# Altium footprint library cool_library.PcbLib: 1182 footprints (part 7 of 75) (continued)
## BGA356X24VF-0.5 [mm] (continued)
Top Overlay:
  lines w0.203: -1.778,0 -1.092,0 ; -1.524,-11.5 -1.016,-11.5 ; -1.473,-0.254 -1.092,0 ; -1.473,0.254 -1.092,0 ; -0.762,0 0,0.762 ; 0,-13.024 0,-12.516 ; 0,1.016 0,1.524 ; 11,-13.024 11,-12.516 ; 11.5,1.016 11.5,1.524 ; 12.516,-11.5 13.024,-11.5 ; 12.516,0 13.024,0 ; -0.762,-12.243 12.243,-12.243 12.243,0.762 -0.762,0.762 -0.762,-12.243

## BGA423x24 [mm]
pads (423):
  round 0.35 smd: A1(0,0) A2(0.65,0) A4(1.95,0) A5(2.6,0) A7(3.9,0) A8(4.55,0) A10(5.85,0) A11(6.5,0) A13(7.8,0) A14(8.45,0) A16(9.75,0) A17(10.4,0) A19(11.7,0) A20(12.35,0) A22(13.65,0) A23(14.3,0) A24(14.95,0) AA1(0,-13) AA2(0.65,-13) AA6(3.25,-13) AA7(3.9,-13) AA9(5.2,-13) AA10(5.85,-13) AA12(7.15,-13) AA13(7.8,-13) AA15(9.1,-13) AA16(9.75,-13) AA18(11.05,-13) AA19(11.7,-13) AA23(14.3,-13) AB2(0.65,-13.65) AB3(1.3,-13.65) AB5(2.6,-13.65) AB6(3.25,-13.65) AB7(3.9,-13.65) AB9(5.2,-13.65) AB10(5.85,-13.65) AB12(7.15,-13.65) AB13(7.8,-13.65) AB15(9.1,-13.65) AB16(9.75,-13.65) AB18(11.05,-13.65) AB19(11.7,-13.65) AB20(12.35,-13.65) AB22(13.65,-13.65) AB23(14.3,-13.65) AB24(14.95,-13.65) AC1(0,-14.3) AC2(0.65,-14.3) AC3(1.3,-14.3) AC4(1.95,-14.3) AC5(2.6,-14.3) AC6(3.25,-14.3) AC7(3.9,-14.3) AC8(4.55,-14.3) AC9(5.2,-14.3) AC10(5.85,-14.3) AC11(6.5,-14.3) AC12(7.15,-14.3) AC13(7.8,-14.3) AC14(8.45,-14.3) AC15(9.1,-14.3) AC16(9.75,-14.3) AC17(10.4,-14.3) AC18(11.05,-14.3) AC19(11.7,-14.3) AC20(12.35,-14.3) AC21(13,-14.3) AC22(13.65,-14.3) AC23(14.3,-14.3) AC24(14.95,-14.3) AD1(0,-14.95) AD2(0.65,-14.95) AD3(1.3,-14.95) AD5(2.6,-14.95) AD6(3.25,-14.95) AD8(4.55,-14.95) AD9(5.2,-14.95) AD11(6.5,-14.95) AD12(7.15,-14.95) AD14(8.45,-14.95) AD15(9.1,-14.95) AD17(10.4,-14.95) AD18(11.05,-14.95) AD20(12.35,-14.95) AD21(13,-14.95) AD23(14.3,-14.95) AD24(14.95,-14.95) B1(0,-0.65) B2(0.65,-0.65) B3(1.3,-0.65) B4(1.95,-0.65) B5(2.6,-0.65) B6(3.25,-0.65) B7(3.9,-0.65) B8(4.55,-0.65) B9(5.2,-0.65) B10(5.85,-0.65) B11(6.5,-0.65) B12(7.15,-0.65) B13(7.8,-0.65) B14(8.45,-0.65) B15(9.1,-0.65) B16(9.75,-0.65) B17(10.4,-0.65) B18(11.05,-0.65) B19(11.7,-0.65) B20(12.35,-0.65) B21(13,-0.65) B22(13.65,-0.65) B23(14.3,-0.65) B24(14.95,-0.65) C1(0,-1.3) C2(0.65,-1.3) C3(1.3,-1.3) C5(2.6,-1.3) C6(3.25,-1.3) C7(3.9,-1.3) C9(5.2,-1.3) C10(5.85,-1.3) C12(7.15,-1.3) C13(7.8,-1.3) C15(9.1,-1.3) C16(9.75,-1.3) C18(11.05,-1.3) C19(11.7,-1.3) C20(12.35,-1.3) C22(13.65,-1.3) C23(14.3,-1.3) D2(0.65,-1.95) D6(3.25,-1.95) D7(3.9,-1.95) D9(5.2,-1.95) D10(5.85,-1.95) D12(7.15,-1.95) D13(7.8,-1.95) D15(9.1,-1.95) D16(9.75,-1.95) D18(11.05,-1.95) D19(11.7,-1.95) D23(14.3,-1.95) D24(14.95,-1.95) E1(0,-2.6) E2(0.65,-2.6) E3(1.3,-2.6) E7(3.9,-2.6) E9(5.2,-2.6) E10(5.85,-2.6) E12(7.15,-2.6) E13(7.8,-2.6) E15(9.1,-2.6) E16(9.75,-2.6) E18(11.05,-2.6) E22(13.65,-2.6) E23(14.3,-2.6) E24(14.95,-2.6) F1(0,-3.25) F2(0.65,-3.25) F3(1.3,-3.25) F4(1.95,-3.25) F6(3.25,-3.25) F7(3.9,-3.25) F9(5.2,-3.25) F10(5.85,-3.25) F12(7.15,-3.25) F13(7.8,-3.25) F15(9.1,-3.25) F16(9.75,-3.25) F18(11.05,-3.25) F19(11.7,-3.25) F21(13,-3.25) F22(13.65,-3.25) F23(14.3,-3.25) G2(0.65,-3.9) G3(1.3,-3.9) G4(1.95,-3.9) G5(2.6,-3.9) G6(3.25,-3.9) G7(3.9,-3.9) G9(5.2,-3.9) G10(5.85,-3.9) G12(7.15,-3.9) G13(7.8,-3.9) G15(9.1,-3.9) G16(9.75,-3.9) G18(11.05,-3.9) G19(11.7,-3.9) G20(12.35,-3.9) G21(13,-3.9) G22(13.65,-3.9) G23(14.3,-3.9) G24(14.95,-3.9) H1(0,-4.55) H2(0.65,-4.55) H8(4.55,-4.55) H9(5.2,-4.55) H10(5.85,-4.55) H11(6.5,-4.55) H12(7.15,-4.55) H13(7.8,-4.55) H14(8.45,-4.55) H15(9.1,-4.55) H16(9.75,-4.55) H17(10.4,-4.55) H23(14.3,-4.55) H24(14.95,-4.55) J1(0,-5.2) J2(0.65,-5.2) J3(1.3,-5.2) J4(1.95,-5.2) J6(3.25,-5.2) J7(3.9,-5.2) J8(4.55,-5.2) J9(5.2,-5.2) J10(5.85,-5.2) J11(6.5,-5.2) J12(7.15,-5.2) J13(7.8,-5.2) J14(8.45,-5.2) J15(9.1,-5.2) J16(9.75,-5.2) J17(10.4,-5.2) J18(11.05,-5.2) J19(11.7,-5.2) J20(12.35,-5.2) J21(13,-5.2) J22(13.65,-5.2) J23(14.3,-5.2) K2(0.65,-5.85) K3(1.3,-5.85) K4(1.95,-5.85) K5(2.6,-5.85) K6(3.25,-5.85) K7(3.9,-5.85) K8(4.55,-5.85) K10(5.85,-5.85) K11(6.5,-5.85) K14(8.45,-5.85) K15(9.1,-5.85) K17(10.4,-5.85) K18(11.05,-5.85) K19(11.7,-5.85) K20(12.35,-5.85) K21(13,-5.85) K22(13.65,-5.85) K23(14.3,-5.85) K24(14.95,-5.85) L1(0,-6.5) L2(0.65,-6.5) L8(4.55,-6.5) L10(5.85,-6.5) L11(6.5,-6.5) L12(7.15,-6.5) L13(7.8,-6.5) L14(8.45,-6.5) L15(9.1,-6.5) L17(10.4,-6.5) L23(14.3,-6.5) L24(14.95,-6.5) M1(0,-7.15) M2(0.65,-7.15) M3(1.3,-7.15) M4(1.95,-7.15) M5(2.6,-7.15) M6(3.25,-7.15) M7(3.9,-7.15) M8(4.55,-7.15) M9(5.2,-7.15) M10(5.85,-7.15) M11(6.5,-7.15) M12(7.15,-7.15) M13(7.8,-7.15) M14(8.45,-7.15) M15(9.1,-7.15) M16(9.75,-7.15) M17(10.4,-7.15) M18(11.05,-7.15) M19(11.7,-7.15) M20(12.35,-7.15) M21(13,-7.15) M22(13.65,-7.15) M23(14.3,-7.15) N2(0.65,-7.8) N3(1.3,-7.8) N4(1.95,-7.8) N5(2.6,-7.8) N6(3.25,-7.8) N7(3.9,-7.8) N8(4.55,-7.8) N9(5.2,-7.8) N10(5.85,-7.8) N11(6.5,-7.8) N12(7.15,-7.8) N13(7.8,-7.8) N14(8.45,-7.8) N15(9.1,-7.8) N16(9.75,-7.8) N17(10.4,-7.8) N18(11.05,-7.8) N19(11.7,-7.8) N20(12.35,-7.8) N21(13,-7.8) N22(13.65,-7.8) N23(14.3,-7.8) N24(14.95,-7.8) P1(0,-8.45) P2(0.65,-8.45) P8(4.55,-8.45) P10(5.85,-8.45) P11(6.5,-8.45) P12(7.15,-8.45) P13(7.8,-8.45) P14(8.45,-8.45) P15(9.1,-8.45) P17(10.4,-8.45) P23(14.3,-8.45) P24(14.95,-8.45) R1(0,-9.1) R2(0.65,-9.1) R3(1.3,-9.1) R4(1.95,-9.1) R5(2.6,-9.1) R6(3.25,-9.1) R7(3.9,-9.1) R8(4.55,-9.1) R10(5.85,-9.1) R11(6.5,-9.1) R14(8.45,-9.1) R15(9.1,-9.1) R17(10.4,-9.1) R18(11.05,-9.1) R19(11.7,-9.1) R20(12.35,-9.1) R21(13,-9.1) R22(13.65,-9.1) R23(14.3,-9.1) T2(0.65,-9.75) T3(1.3,-9.75) T4(1.95,-9.75) T5(2.6,-9.75) T6(3.25,-9.75) T7(3.9,-9.75) T8(4.55,-9.75) T9(5.2,-9.75) T10(5.85,-9.75) T11(6.5,-9.75) T12(7.15,-9.75) T13(7.8,-9.75) T14(8.45,-9.75) T15(9.1,-9.75) T16(9.75,-9.75) T17(10.4,-9.75) T18(11.05,-9.75) T19(11.7,-9.75) T20(12.35,-9.75) T21(13,-9.75) T22(13.65,-9.75) T23(14.3,-9.75) T24(14.95,-9.75) U1(0,-10.4) U2(0.65,-10.4) U8(4.55,-10.4) U9(5.2,-10.4) U10(5.85,-10.4) U11(6.5,-10.4) U12(7.15,-10.4) U13(7.8,-10.4) U14(8.45,-10.4) U15(9.1,-10.4) U16(9.75,-10.4) U17(10.4,-10.4) U23(14.3,-10.4) U24(14.95,-10.4) V1(0,-11.05) V2(0.65,-11.05) V3(1.3,-11.05) V4(1.95,-11.05) V5(2.6,-11.05) V6(3.25,-11.05) V7(3.9,-11.05) V9(5.2,-11.05) V10(5.85,-11.05) V12(7.15,-11.05) V13(7.8,-11.05) V15(9.1,-11.05) V16(9.75,-11.05) V18(11.05,-11.05) V19(11.7,-11.05) V20(12.35,-11.05) V21(13,-11.05) V22(13.65,-11.05) V23(14.3,-11.05) W2(0.65,-11.7) W3(1.3,-11.7) W4(1.95,-11.7) W6(3.25,-11.7) W7(3.9,-11.7) W9(5.2,-11.7) W10(5.85,-11.7) W12(7.15,-11.7) W13(7.8,-11.7) W15(9.1,-11.7) W16(9.75,-11.7) W18(11.05,-11.7) W19(11.7,-11.7) W21(13,-11.7) W22(13.65,-11.7) W23(14.3,-11.7) W24(14.95,-11.7) Y1(0,-12.35) Y2(0.65,-12.35) Y3(1.3,-12.35) Y7(3.9,-12.35) Y9(5.2,-12.35) Y10(5.85,-12.35) Y12(7.15,-12.35) Y13(7.8,-12.35) Y15(9.1,-12.35) Y16(9.75,-12.35) Y18(11.05,-12.35) Y22(13.65,-12.35) Y23(14.3,-12.35) Y24(14.95,-12.35)
Top Overlay:
  lines w0.2: -2.054,0.013 -1.054,0.013 ; -1.454,0.413 -1.054,0.013 ; -1.429,-0.362 -1.054,0.013 ; -0.65,-15.6 15.6,-15.6 15.6,0.65 -0.325,0.65 -0.65,0.325 -0.65,-15.6

## BGA423X24-0.65 [mm]
height 1.27
pads (423):
  round 0.35 smd: A1(0,0) A2(0.65,0) A4(1.95,0) A5(2.6,0) A7(3.9,0) A8(4.55,0) A10(5.85,0) A11(6.5,0) A13(7.8,0) A14(8.45,0) A16(9.75,0) A17(10.4,0) A19(11.7,0) A20(12.35,0) A22(13.65,0) A23(14.3,0) A24(14.95,0) AA1(0,-13) AA2(0.65,-13) AA6(3.25,-13) AA7(3.9,-13) AA9(5.2,-13) AA10(5.85,-13) AA12(7.15,-13) AA13(7.8,-13) AA15(9.1,-13) AA16(9.75,-13) AA18(11.05,-13) AA19(11.7,-13) AA23(14.3,-13) AB2(0.65,-13.65) AB3(1.3,-13.65) AB5(2.6,-13.65) AB6(3.25,-13.65) AB7(3.9,-13.65) AB9(5.2,-13.65) AB10(5.85,-13.65) AB12(7.15,-13.65) AB13(7.8,-13.65) AB15(9.1,-13.65) AB16(9.75,-13.65) AB18(11.05,-13.65) AB19(11.7,-13.65) AB20(12.35,-13.65) AB22(13.65,-13.65) AB23(14.3,-13.65) AB24(14.95,-13.65) AC1(0,-14.3) AC2(0.65,-14.3) AC3(1.3,-14.3) AC4(1.95,-14.3) AC5(2.6,-14.3) AC6(3.25,-14.3) AC7(3.9,-14.3) AC8(4.55,-14.3) AC9(5.2,-14.3) AC10(5.85,-14.3) AC11(6.5,-14.3) AC12(7.15,-14.3) AC13(7.8,-14.3) AC14(8.45,-14.3) AC15(9.1,-14.3) AC16(9.75,-14.3) AC17(10.4,-14.3) AC18(11.05,-14.3) AC19(11.7,-14.3) AC20(12.35,-14.3) AC21(13,-14.3) AC22(13.65,-14.3) AC23(14.3,-14.3) AC24(14.95,-14.3) AD1(0,-14.95) AD2(0.65,-14.95) AD3(1.3,-14.95) AD5(2.6,-14.95) AD6(3.25,-14.95) AD8(4.55,-14.95) AD9(5.2,-14.95) AD11(6.5,-14.95) AD12(7.15,-14.95) AD14(8.45,-14.95) AD15(9.1,-14.95) AD17(10.4,-14.95) AD18(11.05,-14.95) AD20(12.35,-14.95) AD21(13,-14.95) AD23(14.3,-14.95) AD24(14.95,-14.95) B1(0,-0.65) B2(0.65,-0.65) B3(1.3,-0.65) B4(1.95,-0.65) B5(2.6,-0.65) B6(3.25,-0.65) B7(3.9,-0.65) B8(4.55,-0.65) B9(5.2,-0.65) B10(5.85,-0.65) B11(6.5,-0.65) B12(7.15,-0.65) B13(7.8,-0.65) B14(8.45,-0.65) B15(9.1,-0.65) B16(9.75,-0.65) B17(10.4,-0.65) B18(11.05,-0.65) B19(11.7,-0.65) B20(12.35,-0.65) B21(13,-0.65) B22(13.65,-0.65) B23(14.3,-0.65) B24(14.95,-0.65) C1(0,-1.3) C2(0.65,-1.3) C3(1.3,-1.3) C5(2.6,-1.3) C6(3.25,-1.3) C7(3.9,-1.3) C9(5.2,-1.3) C10(5.85,-1.3) C12(7.15,-1.3) C13(7.8,-1.3) C15(9.1,-1.3) C16(9.75,-1.3) C18(11.05,-1.3) C19(11.7,-1.3) C20(12.35,-1.3) C22(13.65,-1.3) C23(14.3,-1.3) D2(0.65,-1.95) D6(3.25,-1.95) D7(3.9,-1.95) D9(5.2,-1.95) D10(5.85,-1.95) D12(7.15,-1.95) D13(7.8,-1.95) D15(9.1,-1.95) D16(9.75,-1.95) D18(11.05,-1.95) D19(11.7,-1.95) D23(14.3,-1.95) D24(14.95,-1.95) E1(0,-2.6) E2(0.65,-2.6) E3(1.3,-2.6) E7(3.9,-2.6) E9(5.2,-2.6) E10(5.85,-2.6) E12(7.15,-2.6) E13(7.8,-2.6) E15(9.1,-2.6) E16(9.75,-2.6) E18(11.05,-2.6) E22(13.65,-2.6) E23(14.3,-2.6) E24(14.95,-2.6) F1(0,-3.25) F2(0.65,-3.25) F3(1.3,-3.25) F4(1.95,-3.25) F6(3.25,-3.25) F7(3.9,-3.25) F9(5.2,-3.25) F10(5.85,-3.25) F12(7.15,-3.25) F13(7.8,-3.25) F15(9.1,-3.25) F16(9.75,-3.25) F18(11.05,-3.25) F19(11.7,-3.25) F21(13,-3.25) F22(13.65,-3.25) F23(14.3,-3.25) G2(0.65,-3.9) G3(1.3,-3.9) G4(1.95,-3.9) G5(2.6,-3.9) G6(3.25,-3.9) G7(3.9,-3.9) G9(5.2,-3.9) G10(5.85,-3.9) G12(7.15,-3.9) G13(7.8,-3.9) G15(9.1,-3.9) G16(9.75,-3.9) G18(11.05,-3.9) G19(11.7,-3.9) G20(12.35,-3.9) G21(13,-3.9) G22(13.65,-3.9) G23(14.3,-3.9) G24(14.95,-3.9) H1(0,-4.55) H2(0.65,-4.55) H8(4.55,-4.55) H9(5.2,-4.55) H10(5.85,-4.55) H11(6.5,-4.55) H12(7.15,-4.55) H13(7.8,-4.55) H14(8.45,-4.55) H15(9.1,-4.55) H16(9.75,-4.55) H17(10.4,-4.55) H23(14.3,-4.55) H24(14.95,-4.55) J1(0,-5.2) J2(0.65,-5.2) J3(1.3,-5.2) J4(1.95,-5.2) J6(3.25,-5.2) J7(3.9,-5.2) J8(4.55,-5.2) J9(5.2,-5.2) J10(5.85,-5.2) J11(6.5,-5.2) J12(7.15,-5.2) J13(7.8,-5.2) J14(8.45,-5.2) J15(9.1,-5.2) J16(9.75,-5.2) J17(10.4,-5.2) J18(11.05,-5.2) J19(11.7,-5.2) J20(12.35,-5.2) J21(13,-5.2) J22(13.65,-5.2) J23(14.3,-5.2) K2(0.65,-5.85) K3(1.3,-5.85) K4(1.95,-5.85) K5(2.6,-5.85) K6(3.25,-5.85) K7(3.9,-5.85) K8(4.55,-5.85) K10(5.85,-5.85) K11(6.5,-5.85) K14(8.45,-5.85) K15(9.1,-5.85) K17(10.4,-5.85) K18(11.05,-5.85) K19(11.7,-5.85) K20(12.35,-5.85) K21(13,-5.85) K22(13.65,-5.85) K23(14.3,-5.85) K24(14.95,-5.85) L1(0,-6.5) L2(0.65,-6.5) L8(4.55,-6.5) L10(5.85,-6.5) L11(6.5,-6.5) L12(7.15,-6.5) L13(7.8,-6.5) L14(8.45,-6.5) L15(9.1,-6.5) L17(10.4,-6.5) L23(14.3,-6.5) L24(14.95,-6.5) M1(0,-7.15) M2(0.65,-7.15) M3(1.3,-7.15) M4(1.95,-7.15) M5(2.6,-7.15) M6(3.25,-7.15) M7(3.9,-7.15) M8(4.55,-7.15) M9(5.2,-7.15) M10(5.85,-7.15) M11(6.5,-7.15) M12(7.15,-7.15) M13(7.8,-7.15) M14(8.45,-7.15) M15(9.1,-7.15) M16(9.75,-7.15) M17(10.4,-7.15) M18(11.05,-7.15) M19(11.7,-7.15) M20(12.35,-7.15) M21(13,-7.15) M22(13.65,-7.15) M23(14.3,-7.15) N2(0.65,-7.8) N3(1.3,-7.8) N4(1.95,-7.8) N5(2.6,-7.8) N6(3.25,-7.8) N7(3.9,-7.8) N8(4.55,-7.8) N9(5.2,-7.8) N10(5.85,-7.8) N11(6.5,-7.8) N12(7.15,-7.8) N13(7.8,-7.8) N14(8.45,-7.8) N15(9.1,-7.8) N16(9.75,-7.8) N17(10.4,-7.8) N18(11.05,-7.8) N19(11.7,-7.8) N20(12.35,-7.8) N21(13,-7.8) N22(13.65,-7.8) N23(14.3,-7.8) N24(14.95,-7.8) P1(0,-8.45) P2(0.65,-8.45) P8(4.55,-8.45) P10(5.85,-8.45) P11(6.5,-8.45) P12(7.15,-8.45) P13(7.8,-8.45) P14(8.45,-8.45) P15(9.1,-8.45) P17(10.4,-8.45) P23(14.3,-8.45) P24(14.95,-8.45) R1(0,-9.1) R2(0.65,-9.1) R3(1.3,-9.1) R4(1.95,-9.1) R5(2.6,-9.1) R6(3.25,-9.1) R7(3.9,-9.1) R8(4.55,-9.1) R10(5.85,-9.1) R11(6.5,-9.1) R14(8.45,-9.1) R15(9.1,-9.1) R17(10.4,-9.1) R18(11.05,-9.1) R19(11.7,-9.1) R20(12.35,-9.1) R21(13,-9.1) R22(13.65,-9.1) R23(14.3,-9.1) T2(0.65,-9.75) T3(1.3,-9.75) T4(1.95,-9.75) T5(2.6,-9.75) T6(3.25,-9.75) T7(3.9,-9.75) T8(4.55,-9.75) T9(5.2,-9.75) T10(5.85,-9.75) T11(6.5,-9.75) T12(7.15,-9.75) T13(7.8,-9.75) T14(8.45,-9.75) T15(9.1,-9.75) T16(9.75,-9.75) T17(10.4,-9.75) T18(11.05,-9.75) T19(11.7,-9.75) T20(12.35,-9.75) T21(13,-9.75) T22(13.65,-9.75) T23(14.3,-9.75) T24(14.95,-9.75) U1(0,-10.4) U2(0.65,-10.4) U8(4.55,-10.4) U9(5.2,-10.4) U10(5.85,-10.4) U11(6.5,-10.4) U12(7.15,-10.4) U13(7.8,-10.4) U14(8.45,-10.4) U15(9.1,-10.4) U16(9.75,-10.4) U17(10.4,-10.4) U23(14.3,-10.4) U24(14.95,-10.4) V1(0,-11.05) V2(0.65,-11.05) V3(1.3,-11.05) V4(1.95,-11.05) V5(2.6,-11.05) V6(3.25,-11.05) V7(3.9,-11.05) V9(5.2,-11.05) V10(5.85,-11.05) V12(7.15,-11.05) V13(7.8,-11.05) V15(9.1,-11.05) V16(9.75,-11.05) V18(11.05,-11.05) V19(11.7,-11.05) V20(12.35,-11.05) V21(13,-11.05) V22(13.65,-11.05) V23(14.3,-11.05) W2(0.65,-11.7) W3(1.3,-11.7) W4(1.95,-11.7) W6(3.25,-11.7) W7(3.9,-11.7) W9(5.2,-11.7) W10(5.85,-11.7) W12(7.15,-11.7) W13(7.8,-11.7) W15(9.1,-11.7) W16(9.75,-11.7) W18(11.05,-11.7) W19(11.7,-11.7) W21(13,-11.7) W22(13.65,-11.7) W23(14.3,-11.7) W24(14.95,-11.7) Y1(0,-12.35) Y2(0.65,-12.35) Y3(1.3,-12.35) Y7(3.9,-12.35) Y9(5.2,-12.35) Y10(5.85,-12.35) Y12(7.15,-12.35) Y13(7.8,-12.35) Y15(9.1,-12.35) Y16(9.75,-12.35) Y18(11.05,-12.35) Y22(13.65,-12.35) Y23(14.3,-12.35) Y24(14.95,-12.35)
Top Overlay:
  lines w0.2: -2.1,-0.05 -1.1,-0.05 ; -1.5,-0.45 -1.1,-0.05 ; -1.475,0.325 -1.1,-0.05 ; 0.05,1 0.05,1.45 ; -0.65,-15.6 15.6,-15.6 15.6,0.65 -0.325,0.65 -0.65,0.325 -0.65,-15.6

## BGA424-25X25-0.5 [mil] "BGA, 424-Leads, Body 13.0x13.0mm,  Pitch 0.50mm"
height 47.24
pads (424):
  round 12 smd mask+3: A2(-216.54,236.22) A3(-196.85,236.22) A4(-177.17,236.22) A5(-157.48,236.22) A6(-137.8,236.22) A7(-118.11,236.22) A8(-98.43,236.22) A9(-78.74,236.22) A10(-59.06,236.22) A11(-39.37,236.22) A12(-19.69,236.22) A13(0,236.22) A14(19.68,236.22) A15(39.37,236.22) A16(59.06,236.22) A17(78.74,236.22) A18(98.43,236.22) A19(118.11,236.22) A20(137.8,236.22) A21(157.48,236.22) A22(177.17,236.22) A23(196.85,236.22) A24(216.54,236.22) AA1(-236.22,-157.48) AA2(-216.54,-157.48) AA3(-196.85,-157.48) AA23(196.85,-157.48) AA24(216.54,-157.48) AA25(236.22,-157.48) AB1(-236.22,-177.17) AB2(-216.54,-177.17) AB3(-196.85,-177.17) AB6(-137.8,-177.17) AB7(-118.11,-177.17) AB8(-98.43,-177.17) AB9(-78.74,-177.17) AB10(-59.06,-177.17) AB11(-39.37,-177.17) AB12(-19.69,-177.17) AB13(0,-177.17) AB14(19.68,-177.17) AB15(39.37,-177.17) AB16(59.06,-177.17) AB17(78.74,-177.17) AB18(98.43,-177.17) AB19(118.11,-177.17) AB20(137.8,-177.17) AB23(196.85,-177.17) AB24(216.54,-177.17) AB25(236.22,-177.17) AC1(-236.22,-196.85) AC2(-216.54,-196.85) AC3(-196.85,-196.85) AC4(-177.17,-196.85) AC5(-157.48,-196.85) AC6(-137.8,-196.85) AC7(-118.11,-196.85) AC8(-98.43,-196.85) AC9(-78.74,-196.85) AC10(-59.06,-196.85) AC11(-39.37,-196.85) AC12(-19.69,-196.85) AC13(0,-196.85) AC14(19.68,-196.85) AC15(39.37,-196.85) AC16(59.06,-196.85) AC17(78.74,-196.85) AC18(98.43,-196.85) AC19(118.11,-196.85) AC20(137.8,-196.85) AC21(157.48,-196.85) AC22(177.17,-196.85) AC23(196.85,-196.85) AC24(216.54,-196.85) AC25(236.22,-196.85) AD1(-236.22,-216.54) AD2(-216.54,-216.54) AD3(-196.85,-216.54) AD4(-177.17,-216.54) AD5(-157.48,-216.54) AD6(-137.8,-216.54) AD7(-118.11,-216.54) AD8(-98.43,-216.54) AD9(-78.74,-216.54) AD10(-59.06,-216.54) AD11(-39.37,-216.54) AD12(-19.69,-216.54) AD13(0,-216.54) AD14(19.68,-216.54) AD15(39.37,-216.54) AD16(59.06,-216.54) AD17(78.74,-216.54) AD18(98.43,-216.54) AD19(118.11,-216.54) AD20(137.8,-216.54) AD21(157.48,-216.54) AD22(177.17,-216.54) AD23(196.85,-216.54) AD24(216.54,-216.54) AD25(236.22,-216.54) AE2(-216.54,-236.22) AE3(-196.85,-236.22) AE4(-177.17,-236.22) AE5(-157.48,-236.22) AE6(-137.8,-236.22) AE7(-118.11,-236.22) AE8(-98.43,-236.22) AE9(-78.74,-236.22) AE10(-59.06,-236.22) AE11(-39.37,-236.22) AE12(-19.69,-236.22) AE13(0,-236.22) AE14(19.68,-236.22) AE15(39.37,-236.22) AE16(59.06,-236.22) AE17(78.74,-236.22) AE18(98.43,-236.22) AE19(118.11,-236.22) AE20(137.8,-236.22) AE21(157.48,-236.22) AE22(177.17,-236.22) AE23(196.85,-236.22) AE24(216.54,-236.22) B1(-236.22,216.54) B2(-216.54,216.54) B3(-196.85,216.54) B4(-177.17,216.54) B5(-157.48,216.54) B6(-137.8,216.54) B7(-118.11,216.54) B8(-98.43,216.54) B9(-78.74,216.54) B10(-59.06,216.54) B11(-39.37,216.54) B12(-19.69,216.54) B13(0,216.54) B14(19.68,216.54) B15(39.37,216.54) B16(59.06,216.54) B17(78.74,216.54) B18(98.43,216.54) B19(118.11,216.54) B20(137.8,216.54) B21(157.48,216.54) B22(177.17,216.54) B23(196.85,216.54) B24(216.54,216.54) B25(236.22,216.54) C1(-236.22,196.85) C2(-216.54,196.85) C3(-196.85,196.85) C4(-177.17,196.85) C5(-157.48,196.85) C6(-137.8,196.85) C7(-118.11,196.85) C8(-98.43,196.85) C9(-78.74,196.85) C10(-59.06,196.85) C11(-39.37,196.85) C12(-19.69,196.85) C13(0,196.85) C14(19.68,196.85) C15(39.37,196.85) C16(59.06,196.85) C17(78.74,196.85) C18(98.43,196.85) C19(118.11,196.85) C20(137.8,196.85) C21(157.48,196.85) C22(177.17,196.85) C23(196.85,196.85) C24(216.54,196.85) C25(236.22,196.85) D1(-236.22,177.17) D2(-216.54,177.17) D3(-196.85,177.17) D6(-137.8,177.17) D7(-118.11,177.17) D8(-98.43,177.17) D9(-78.74,177.17) D10(-59.06,177.17) D11(-39.37,177.17) D12(-19.69,177.17) D13(0,177.17) D14(19.68,177.17) D15(39.37,177.17) D16(59.06,177.17) D17(78.74,177.17) D18(98.43,177.17) D19(118.11,177.17) D20(137.8,177.17) D23(196.85,177.17) D24(216.54,177.17) D25(236.22,177.17) E1(-236.22,157.48) E2(-216.54,157.48) E3(-196.85,157.48) E23(196.85,157.48) E24(216.54,157.48) E25(236.22,157.48) F1(-236.22,137.8) F2(-216.54,137.8) F3(-196.85,137.8) F4(-177.17,137.8) F22(177.17,137.8) F23(196.85,137.8) F24(216.54,137.8) F25(236.22,137.8) G1(-236.22,118.11) G2(-216.54,118.11) G3(-196.85,118.11) G4(-177.17,118.11) G8(-98.43,118.11) G9(-78.74,118.11) G10(-59.06,118.11) G11(-39.37,118.11) G12(-19.69,118.11) G13(0,118.11) G14(19.68,118.11) G15(39.37,118.11) G16(59.06,118.11) G17(78.74,118.11) G18(98.43,118.11) G22(177.17,118.11) G23(196.85,118.11) G24(216.54,118.11) G25(236.22,118.11) H1(-236.22,98.43) H2(-216.54,98.43) H3(-196.85,98.43) H4(-177.17,98.43) H7(-118.11,98.43) H8(-98.43,98.43) H9(-78.74,98.43) H10(-59.06,98.43) H11(-39.37,98.43) H12(-19.69,98.43) H13(0,98.43) H14(19.68,98.43) H15(39.37,98.43) H16(59.06,98.43) H17(78.74,98.43) H18(98.43,98.43) H19(118.11,98.43) H22(177.17,98.43) H23(196.85,98.43) H24(216.54,98.43) H25(236.22,98.43) J1(-236.22,78.74) J2(-216.54,78.74) J3(-196.85,78.74) J4(-177.17,78.74) J7(-118.11,78.74) J8(-98.43,78.74) J11(-39.37,78.74) J12(-19.69,78.74) J13(0,78.74) J14(19.68,78.74) J15(39.37,78.74) J18(98.43,78.74) J19(118.11,78.74) J22(177.17,78.74) J23(196.85,78.74) J24(216.54,78.74) J25(236.22,78.74) K1(-236.22,59.06) K2(-216.54,59.06) K3(-196.85,59.06) K4(-177.17,59.06) K7(-118.11,59.06) K8(-98.43,59.06) K18(98.43,59.06) K19(118.11,59.06) K22(177.17,59.06) K23(196.85,59.06) K24(216.54,59.06) K25(236.22,59.06) L1(-236.22,39.37) L2(-216.54,39.37) L3(-196.85,39.37) L4(-177.17,39.37) L7(-118.11,39.37) L8(-98.43,39.37) L9(-78.74,39.37) L17(78.74,39.37) L18(98.43,39.37) L19(118.11,39.37) L22(177.17,39.37) L23(196.85,39.37) L24(216.54,39.37) L25(236.22,39.37) M1(-236.22,19.69) M2(-216.54,19.69) M3(-196.85,19.69) M4(-177.17,19.69) M7(-118.11,19.69) M8(-98.43,19.69) M9(-78.74,19.69) M17(78.74,19.69) M18(98.43,19.69) M19(118.11,19.69) M22(177.17,19.69) M23(196.85,19.69) M24(216.54,19.69) M25(236.22,19.69) N1(-236.22,0) N2(-216.54,0) N3(-196.85,0) N4(-177.17,0) N7(-118.11,0) N8(-98.43,0) N9(-78.74,0) N17(78.74,0) N18(98.43,0) N19(118.11,0) N22(177.17,0) N23(196.85,0) N24(216.54,0) N25(236.22,0) P1(-236.22,-19.68) P2(-216.54,-19.68) P3(-196.85,-19.68) P4(-177.17,-19.68) P7(-118.11,-19.68) P8(-98.43,-19.68) P9(-78.74,-19.68) P17(78.74,-19.68) P18(98.43,-19.68) P19(118.11,-19.68) P22(177.17,-19.68) P23(196.85,-19.68) P24(216.54,-19.68) P25(236.22,-19.68) R1(-236.22,-39.37) R2(-216.54,-39.37) R3(-196.85,-39.37) R4(-177.17,-39.37) R7(-118.11,-39.37) R8(-98.43,-39.37) R9(-78.74,-39.37) R17(78.74,-39.37) R18(98.43,-39.37) R19(118.11,-39.37) R22(177.17,-39.37) R23(196.85,-39.37) R24(216.54,-39.37) R25(236.22,-39.37) T1(-236.22,-59.06) T2(-216.54,-59.06) T3(-196.85,-59.06) T4(-177.17,-59.06) T7(-118.11,-59.06) T8(-98.43,-59.06) T18(98.43,-59.06) T19(118.11,-59.06) T22(177.17,-59.06) T23(196.85,-59.06) T24(216.54,-59.06) T25(236.22,-59.06) U1(-236.22,-78.74) U2(-216.54,-78.74) U3(-196.85,-78.74) U4(-177.17,-78.74) U7(-118.11,-78.74) U8(-98.43,-78.74) U11(-39.37,-78.74) U12(-19.69,-78.74) U13(0,-78.74) U14(19.68,-78.74) U15(39.37,-78.74) U18(98.43,-78.74) U19(118.11,-78.74) U22(177.17,-78.74) U23(196.85,-78.74) U24(216.54,-78.74) U25(236.22,-78.74) V1(-236.22,-98.43) V2(-216.54,-98.43) V3(-196.85,-98.43) V4(-177.17,-98.43) V7(-118.11,-98.43) V8(-98.43,-98.43) V9(-78.74,-98.43) V10(-59.06,-98.43) V11(-39.37,-98.43) V12(-19.69,-98.43) V13(0,-98.43) V14(19.68,-98.43) V15(39.37,-98.43) V16(59.06,-98.43) V17(78.74,-98.43) V18(98.43,-98.43) V19(118.11,-98.43) V22(177.17,-98.43) V23(196.85,-98.43) V24(216.54,-98.43) V25(236.22,-98.43) W1(-236.22,-118.11) W2(-216.54,-118.11) W3(-196.85,-118.11) W4(-177.17,-118.11) W8(-98.43,-118.11) W9(-78.74,-118.11) W10(-59.06,-118.11) W11(-39.37,-118.11) W12(-19.69,-118.11) W13(0,-118.11) W14(19.68,-118.11) W15(39.37,-118.11) W16(59.06,-118.11) W17(78.74,-118.11) W18(98.43,-118.11) W22(177.17,-118.11) W23(196.85,-118.11) W24(216.54,-118.11) W25(236.22,-118.11) Y1(-236.22,-137.8) Y2(-216.54,-137.8) Y3(-196.85,-137.8) Y4(-177.17,-137.8) Y22(177.17,-137.8) Y23(196.85,-137.8) Y24(216.54,-137.8) Y25(236.22,-137.8)
Top Overlay:
  circle w9.84: c-272.92,235 r4.92
  region: -216.54,255.37 -255.91,216 -255.91,255.37
  lines w7.87: -255.91,216 -216.54,255.37 ; -255.91,-255.91 255.91,-255.91 255.91,255.91 -255.91,255.91 -255.91,-255.91